# Altium footprint library SMPSProject.PcbLib: 143 footprints (part 2 of 9)
Each footprint in its own frame and in the unit in brackets; x right, y up, seen from the top. Pads: shape width x height; smd on the part's side, far side on the other; paste and mask are expansions set on the pad; w line width, h text height; cw(c..) or ccw(c..) is an arc to the next point about the centre after c.
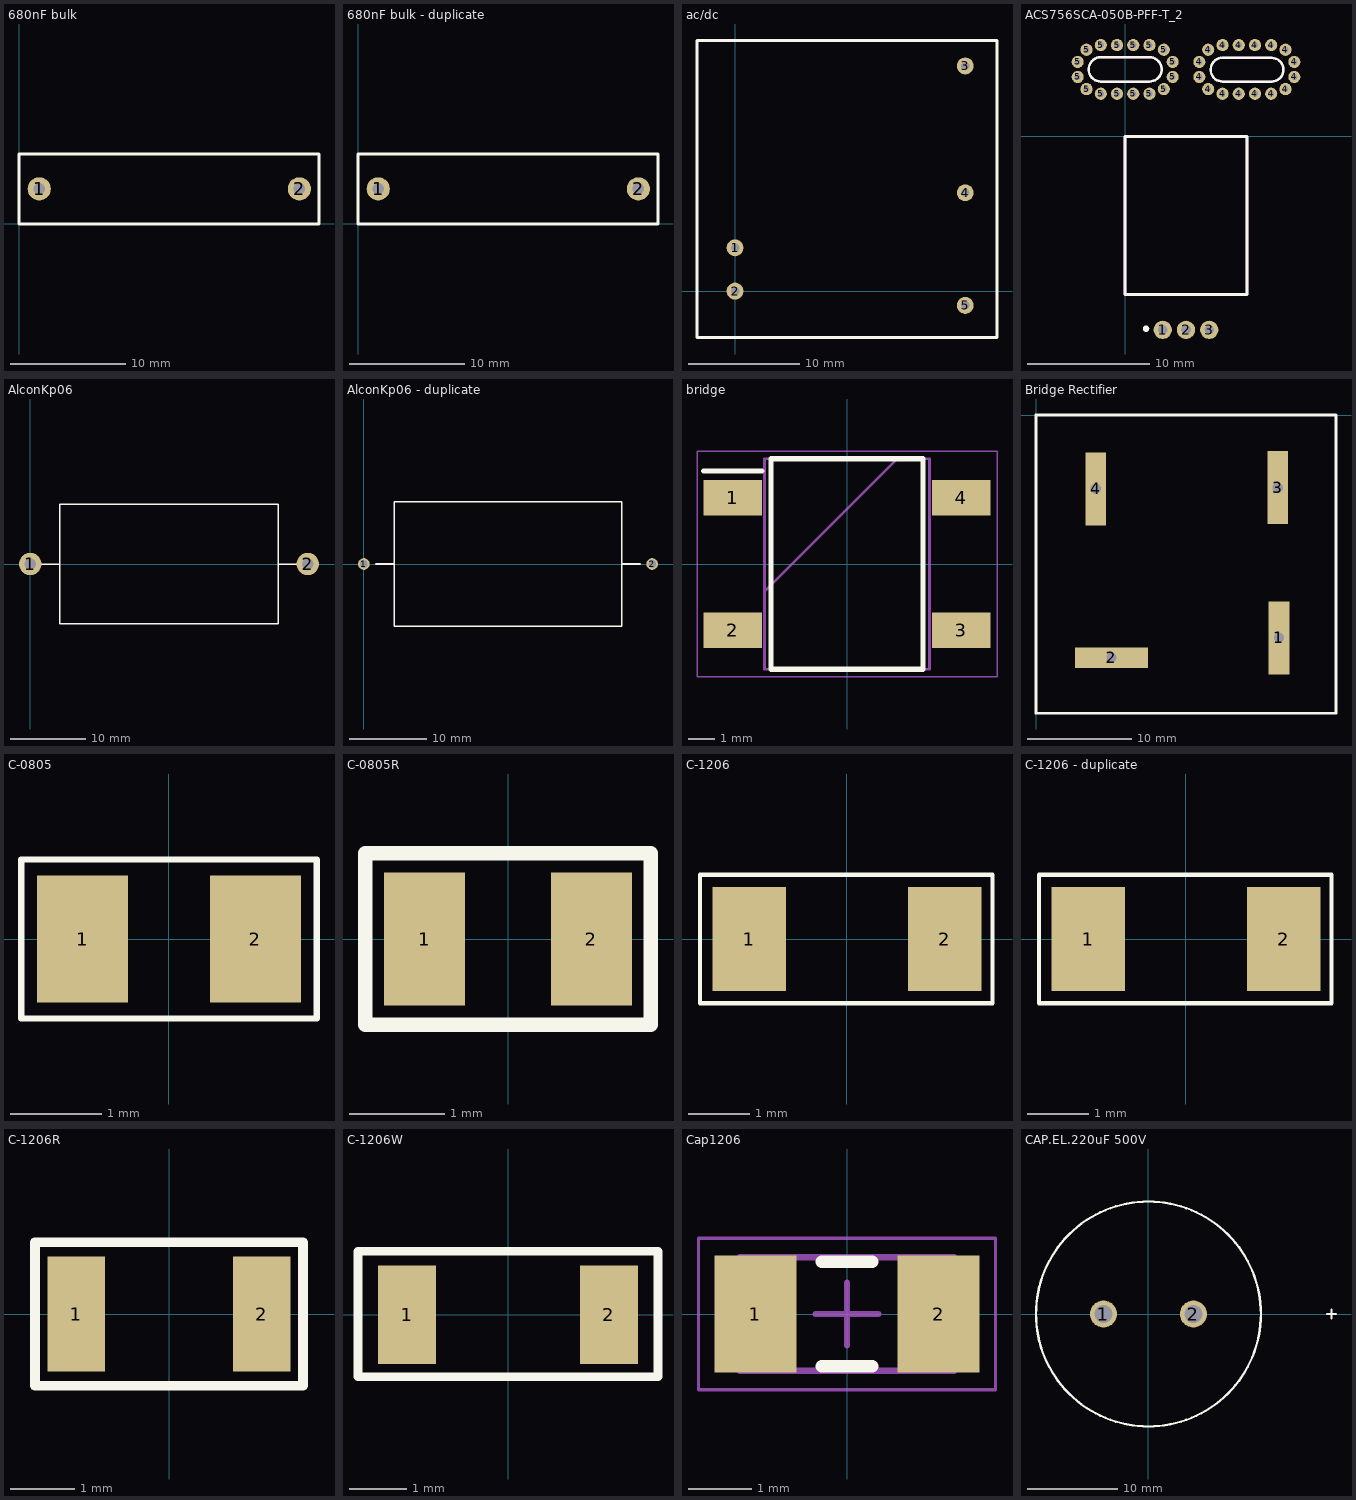
[diagram p1: the footprints below, top view; thin cyan lines are the x and y axes]

## 680nF bulk [mm]
pads (2):
  round 2 hole 1: 1(1.75,3) 2(24.25,3)
Top Overlay:
  lines w0.254: 0,-0.025 0,6 25.95,6 25.95,-0.025 0,-0.025
3D body "WIMA_FILM_CAPACITOR_RADIAL_26.5x6.0x15.0_P22.5.step": height 15, standoff -3.5, extent -0.35,-0.05 26.15,5.95

## 680nF bulk - duplicate [mm]
pads (2):
  round 2 hole 1: 1(1.75,3) 2(24.25,3)
Top Overlay:
  lines w0.254: 0,-0.025 0,6 25.95,6 25.95,-0.025 0,-0.025
3D body "WIMA_FILM_CAPACITOR_RADIAL_26.5x6.0x15.0_P22.5.step": height 15, standoff -3.5, extent -0.35,-0.05 26.15,5.95

## ac/dc [mil]
pads (5):
  round 60 hole 30: 1(0,153.54) 2(0,0) 3(817.32,799.21) 4(817.32,349.21) 5(817.32,-50.79)
Top Overlay:
  lines w10: -135,-165 -135,890 930,890 930,-165 -110,-165 -135,-165

## ACS756SCA-050B-PFF-T_2 [mm]
pads (35):
  round 1.5 hole 0.8: 1(3.09,-15.9) 2(5,-15.9) 3(6.91,-15.9)
  round 1 hole 0.5: 4(6.098,4.882) 4(6.098,6.118) 4(6.824,3.882) 4(6.824,7.118) 4(8,3.5) 4(8,7.5) 4(9.333,3.5) 4(9.333,7.5) 4(10.667,3.5) 4(10.667,7.5) 4(12,3.5) 4(12,7.5) 4(13.176,3.882) 4(13.176,7.118) 4(13.902,4.882) 4(13.902,6.118) 5(-3.902,4.882) 5(-3.902,6.118) 5(-3.176,3.882) 5(-3.176,7.118) 5(-2,3.5) 5(-2,7.5) 5(-0.667,3.5) 5(-0.667,7.5) 5(0.667,3.5) 5(0.667,7.5) 5(2,3.5) 5(2,7.5) 5(3.176,3.882) 5(3.176,7.118) 5(3.902,4.882) 5(3.902,6.118)
Top Overlay:
  circle w0.254: c1.715,-15.803 r0.139
  lines w0.2: -2,4.5 cw(c-2,5.5) -2,6.5 2,6.5 cw(c2,5.5) 2,4.5 -2,4.5 ; 8,4.5 cw(c8,5.477) 8,6.455 12.057,6.455 cw(c12.028,5.477) 12.057,4.5 8,4.5
  lines w0.254: 0,-13 10,-13 10,0 0,0 0,-13
Mechanical 13:
  lines w0.2: -2,4.5 cw(c-2,5.5) -2,6.5 2,6.5 cw(c2,5.5) 2,4.5 -2,4.5 ; 8,4.5 cw(c8,5.477) 8,6.455 12.057,6.455 cw(c12.028,5.478) 12.057,4.5 8,4.5
  lines w0.254: 0,-13 10,-13 10,0 0,0 0,-13

## AlconKp06 [mm]
pads (2):
  round 3 hole 1.5: 1(0,0) 2(37,0)
Top Overlay:
  lines w0.2: 1.5,0 3.925,0 ; 33.075,0 35.5,0 ; 3.925,0 3.925,8 33.075,8 33.075,-8 3.925,-8 3.925,0
3D body "User Library-CAP ICEL 1200 0_22.STEP": height 18.01, standoff -5.99, extent -1,-8.975 38,9.025

## AlconKp06 - duplicate [mm]
pads (2):
  round 1.5 hole 1: 1(0,0) 2(37,0)
Top Overlay:
  lines w0.2: 1.5,0 3.925,0 ; 33.075,0 35.5,0 ; 3.925,0 3.925,-8 33.075,-8 33.075,8 3.925,8 3.925,0
3D body "User Library-CAP ICEL 1200 0_22.STEP": height 18.01, standoff -5.99, extent -1,-8.975 38,9.025

## bridge [mm]
pads (4):
  rect 2.25x1.35 smd: 1(-4.4,2.55) 2(-4.4,-2.55) 3(4.4,-2.55) 4(4.4,2.55)
Top Overlay:
  lines w0.2: -5.525,3.575 -3.275,3.575 ; -2.925,-4.05 -2.925,4.05 2.925,4.05 2.925,-4.05 -2.925,-4.05
Mechanical 13:
  lines w0.1: -3.175,-1.05 1.925,4.05 ; -3.175,-4.05 -3.175,4.05 3.175,4.05 3.175,-4.05 -3.175,-4.05
Mechanical 15:
  lines w0.05: -5.775,-4.35 -5.775,4.35 5.775,4.35 5.775,-4.35 -5.775,-4.35
3D body "DF005S-G.stp": height 2.8, standoff 0, extent -5.075,-4.05 5.075,4.05

## Bridge Rectifier [mm]
pads (4):
  rect 2x7 hole 1 square: 1(23.368,-21.463) 3(23.241,-6.985) 4(5.715,-7.112)
  rect 7x2 hole 1 square: 2(7.239,-23.368)
Top Overlay:
  lines w0.254: -0.031,0.045 -0.031,-28.733 28.86,-28.733 28.86,0 0,0
3D body "Rectifier KBPC3510 v1.step": height 11.01, standoff -11.01, extent 0.702,-28.127 28.702,-0.127

## C-0805 [mm]
pads (2):
  rect 1x1.4 smd: 1(-0.95,0) 2(0.95,0)
Top Overlay:
  lines w0.07: -1.625,-0.875 -0.391,-0.875 0.416,-0.875 1.625,-0.875 1.625,0.875 -1.625,0.875 -1.625,0.413 -1.625,-0.875
3D body "User Library-CAPC2013X10.STEP": height 1.01, standoff 0.01, extent -1,-0.625 1,0.625

## C-0805R [mm] "capacitor 0805 reflow soldering"
pads (2):
  rect 0.85x1.4 smd: 1(-0.875,0) 2(0.875,0)
Top Overlay:
  lines w0.152: -1.5,-0.9 -1.5,0.9 1.5,0.9 1.5,-0.9 0.625,-0.9 -1.5,-0.9
3D body "CAP0805.stp": height 0.78, standoff 0, extent -1,-0.625 1,0.625

## C-1206 [mm]
pads (2):
  rect 1.2x1.7 smd: 1(-1.6,0) 2(1.6,0)
Top Overlay:
  lines w0.07: -2.4,-1.05 -2.4,1.05 2.375,1.05 2.375,0.692 2.375,0.556 2.375,-0.531 2.375,-1.05 -2.4,-1.05
3D body "User Library-CAPC3216X10.STEP": height 1, standoff 0, extent -1.6,-0.8 1.6,0.8

## C-1206 - duplicate [mm]
pads (2):
  rect 1.2x1.7 smd: 1(-1.6,0) 2(1.6,0)
Top Overlay:
  lines w0.07: -2.4,-1.05 -2.4,1.05 2.375,1.05 2.375,0.692 2.375,0.556 2.375,-0.531 2.375,-1.05 -2.4,-1.05
3D body "User Library-CAPC3216X10.STEP": height 1, standoff 0, extent -1.6,-0.8 1.6,0.8

## C-1206R [mm] "capacitor 1206 reflow soldering"
pads (2):
  rect 0.9x1.8 smd: 1(-1.45,0) 2(1.45,0)
Top Overlay:
  lines w0.152: -2.1,-1.125 2.1,-1.125 2.1,1.125 1.13,1.125 -2.1,1.125 -2.1,-1.125
3D body "CAP1206.stp": height 1, standoff 0, extent -1.6,-0.8 1.6,0.8

## C-1206W [mm] "capacitor 1206 wave soldering"
pads (2):
  rect 1x1.7 smd: 1(-1.75,0) 2(1.75,0)
Top Overlay:
  lines w0.152: -2.6,-1.075 -2.6,1.1 2.6,1.1 2.6,-1.075 2.45,-1.075 -2.6,-1.075
3D body "CAP1206.stp": height 1, standoff 0, extent -1.6,-0.8 1.6,0.8

## Cap1206 [mm]
height 1
pads (2):
  rect 1.3x1.85 smd: 1(-1.45,0) 2(1.45,0)
Top Overlay:
  lines w0.2: -0.4,-0.825 0.4,-0.825 ; -0.4,0.825 0.4,0.825
Top Courtyard:
  lines w0.05: -2.35,-1.2 2.35,-1.2 2.35,1.2 -2.35,1.2 -2.35,-1.2
  lines w0.1: -0.5,0 0.5,0 ; 0,-0.5 0,0.5
Top Assembly:
  lines w0.1: -1.7,-0.9 1.7,-0.9 1.7,0.9 -1.7,0.9 -1.7,-0.9
3D body "User Library-Vhip cap 1206.step": height 1.75, standoff 0.01, extent -1.65,-0.85 1.55,0.85

## CAP.EL.220uF 500V [mm]
pads (2):
  round 3 hole 2: 1(-5,0) 2(5,0)
Top Overlay:
  circle w0.254: c0,0 r12.5
  lines w0.2: 19.832,0 20.848,0 ; 20.34,-0.508 20.34,0.508